# Altium footprint library Dr.Xiong_20160818.PcbLib: 266 footprints (part 17 of 17)
Each footprint in its own frame and in the unit in brackets; x right, y up, seen from the top. Pads: shape width x height; smd on the part's side, far side on the other; paste and mask are expansions set on the pad; w line width, h text height; cw(c..) or ccw(c..) is an arc to the next point about the centre after c.
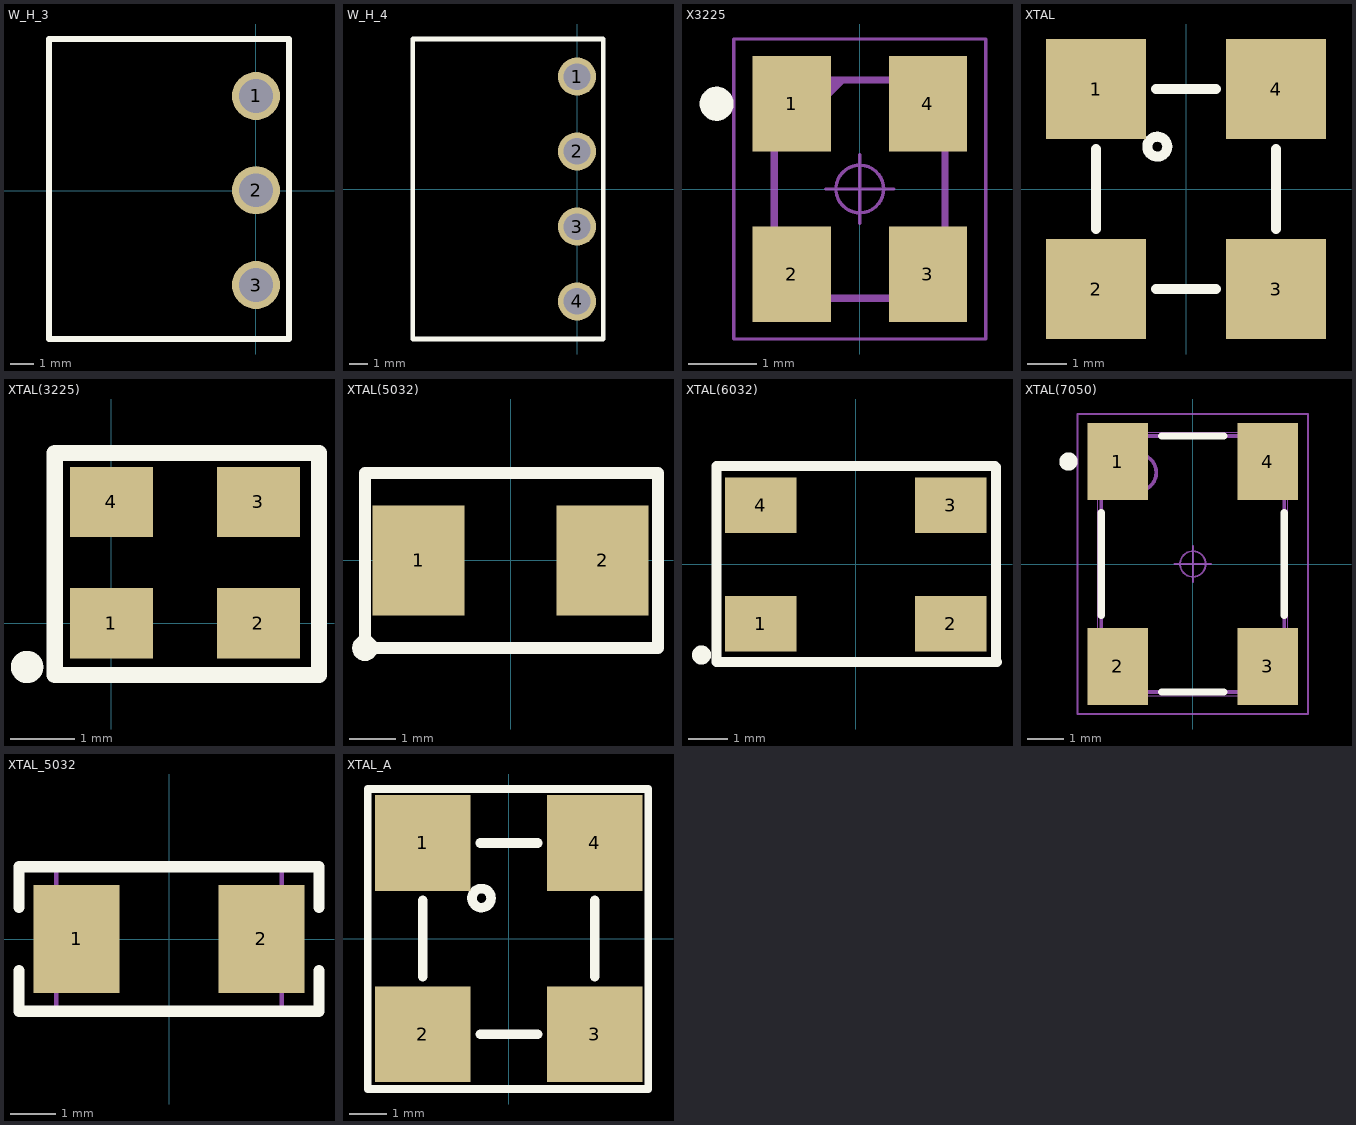
[diagram p16: the footprints below, top view; thin cyan lines are the x and y axes]

## W_H_3 [mil]
pads (3):
  round 80 hole 56: 1(0,157.5) 2(0,0.5) 3(0,-157.5)
Top Overlay:
  lines w10: -345,-247.5 0,-247.5 55,-247.5 55,252.5 0,252.5 -345,252.5 -345,-247.5

## W_H_4 [mil]
pads (4):
  round 80 hole 56: 1(0,235.98) 2(0,78.98) 3(0,-78.98) 4(0,-235.98)
Top Overlay:
  lines w10: -345,-314.96 55,-314.96 55,314.96 -16.02,314.96 -345,314.96 -345,-314.96

## X3225 [mm]
pads (4):
  rect 1.15x1.4 smd: 1(-1,1.25) 2(-1,-1.25) 3(1,-1.25) 4(1,1.25)
Top Overlay:
  circle w0.25: c-2.1,1.25 r0.125
Mechanical 15:
  lines w0.1: -1.25,0.6 -0.25,1.6 ; -1.25,0.7 -0.35,1.6 ; -1.25,0.8 -0.45,1.6 ; -1.25,0.9 -0.55,1.6 ; -1.25,1 -0.65,1.6 ; -1.25,1.1 -0.75,1.6 ; -1.25,1.2 -0.85,1.6 ; -1.25,1.3 -0.95,1.6 ; -1.25,1.4 -1.05,1.6 ; -1.25,1.5 -1.15,1.6 ; -1.25,-1.6 1.25,-1.6 1.25,1.6 -1.25,1.6 -1.25,-1.6
Mechanical 16:
  circle w0.05: c0,0 r0.35
  lines w0.001: -1.3,-1.65 1.3,-1.65 1.3,1.65 -1.3,1.65 -1.3,-1.65
  lines w0.05: -0.5,0 0.5,0 ; 0,-0.5 0,0.5 ; -1.85,-2.2 1.85,-2.2 1.85,2.2 -1.85,2.2 -1.85,-2.2

## XTAL [mil]
pads (4):
  rect 100x100 smd: 1(-90,100) 2(-90,-100) 3(90,-100) 4(90,100)
Top Overlay:
  circle w10: c-28.7,42.32 r10
  lines w10: -90,-40 -90,40 ; -30,-100 30,-100 ; -30,100 30,100 ; 90,-40 90,40

## XTAL(3225) [mm]
pads (4):
  rect 1.3x1.1 smd: 1(0,0) 2(2.3,0) 3(2.3,1.9) 4(0,1.9)
Top Overlay:
  circle w0.254: c-1.321,-0.686 r0.127
  lines w0.254: -0.889,-0.813 -0.889,2.667 3.251,2.667 3.251,-0.813 -0.889,-0.813

## XTAL(5032) [mm]
pads (2):
  rect 2x2.4 smd: 1(-2,0) 2(2,0)
Top Overlay:
  lines w0.254: -3.168,1.854 -3.168,-1.905 3.207,-1.905 3.207,1.854 ; -3.168,1.905 3.207,1.905 ; -3.019,-1.935 cw(c-3.168,-1.905) -3.016,-1.905

## XTAL(6032) [mm]
pads (4):
  rect 1.8x1.4 smd: 1(-2.4,-1.5) 2(2.4,-1.5) 3(2.4,1.5) 4(-2.4,1.5)
Top Overlay:
  circle w0.254: c-3.899,-2.287 r0.114
  lines w0.254: 3.518,2.488 -3.518,2.488 -3.518,-2.465 3.569,-2.465 ; 3.544,-2.465 3.544,2.462

## XTAL(7050) [mm]
pads (4):
  rect 1.65x2.1 smd: 1(-2.05,2.8) 2(-2.05,-2.8) 3(2.05,-2.8) 4(2.05,2.8)
Top Overlay:
  circle w0.25: c-3.4,2.8 r0.125
  lines w0.2: -2.5,-1.4 -2.5,1.4 ; -0.85,-3.5 0.85,-3.5 ; -0.85,3.5 0.85,3.5 ; 2.5,-1.4 2.5,1.4
Mechanical 15:
  circle w0.1: c-1.5,2.5 r0.5
  lines w0.1: -2.5,-3.5 -2.5,3.5 2.5,3.5 2.5,-3.5 -2.5,-3.5
Mechanical 16:
  circle w0.05: c0,0 r0.35
  lines w0.001: -2.6,-3.6 -2.6,3.6 2.6,3.6 2.6,-3.6 -2.6,-3.6
  lines w0.05: -0.5,0 0.5,0 ; 0,-0.5 0,0.5 ; -3.15,-4.1 -3.15,4.1 3.15,4.1 3.15,-4.1 -3.15,-4.1

## XTAL_5032 [mm]
pads (2):
  rect 1.9x2.4 smd: 1(-2.05,0) 2(2.05,0)
Top Overlay:
  lines w0.254: -3.325,-0.7 -3.325,-1.6 3.325,-1.6 3.325,-0.7 ; -3.325,0.7 -3.325,1.6 3.325,1.6 3.325,0.7
Mechanical 13:
  lines w0.1: -2.5,-1.6 -2.5,1.6 2.5,1.6 2.5,-1.6 -2.5,-1.6

## XTAL_A [mil]
pads (4):
  rect 100x100 smd: 1(-90,100) 2(-90,-100) 3(90,-100) 4(90,100)
Top Overlay:
  circle w10: c-28.7,42.32 r10
  lines w8: -147.64,-157.48 -147.64,156.5 145.67,156.5 145.67,-157.48 -147.64,-157.48
  lines w10: -90,-40 -90,40 ; -30,-100 30,-100 ; -30,100 30,100 ; 90,-40 90,40